# Altium footprint library common.PcbLib: 552 footprints (part 21 of 35)
Each footprint in its own frame and in the unit in brackets; x right, y up, seen from the top. Pads: shape width x height; smd on the part's side, far side on the other; paste and mask are expansions set on the pad; w line width, h text height; cw(c..) or ccw(c..) is an arc to the next point about the centre after c.
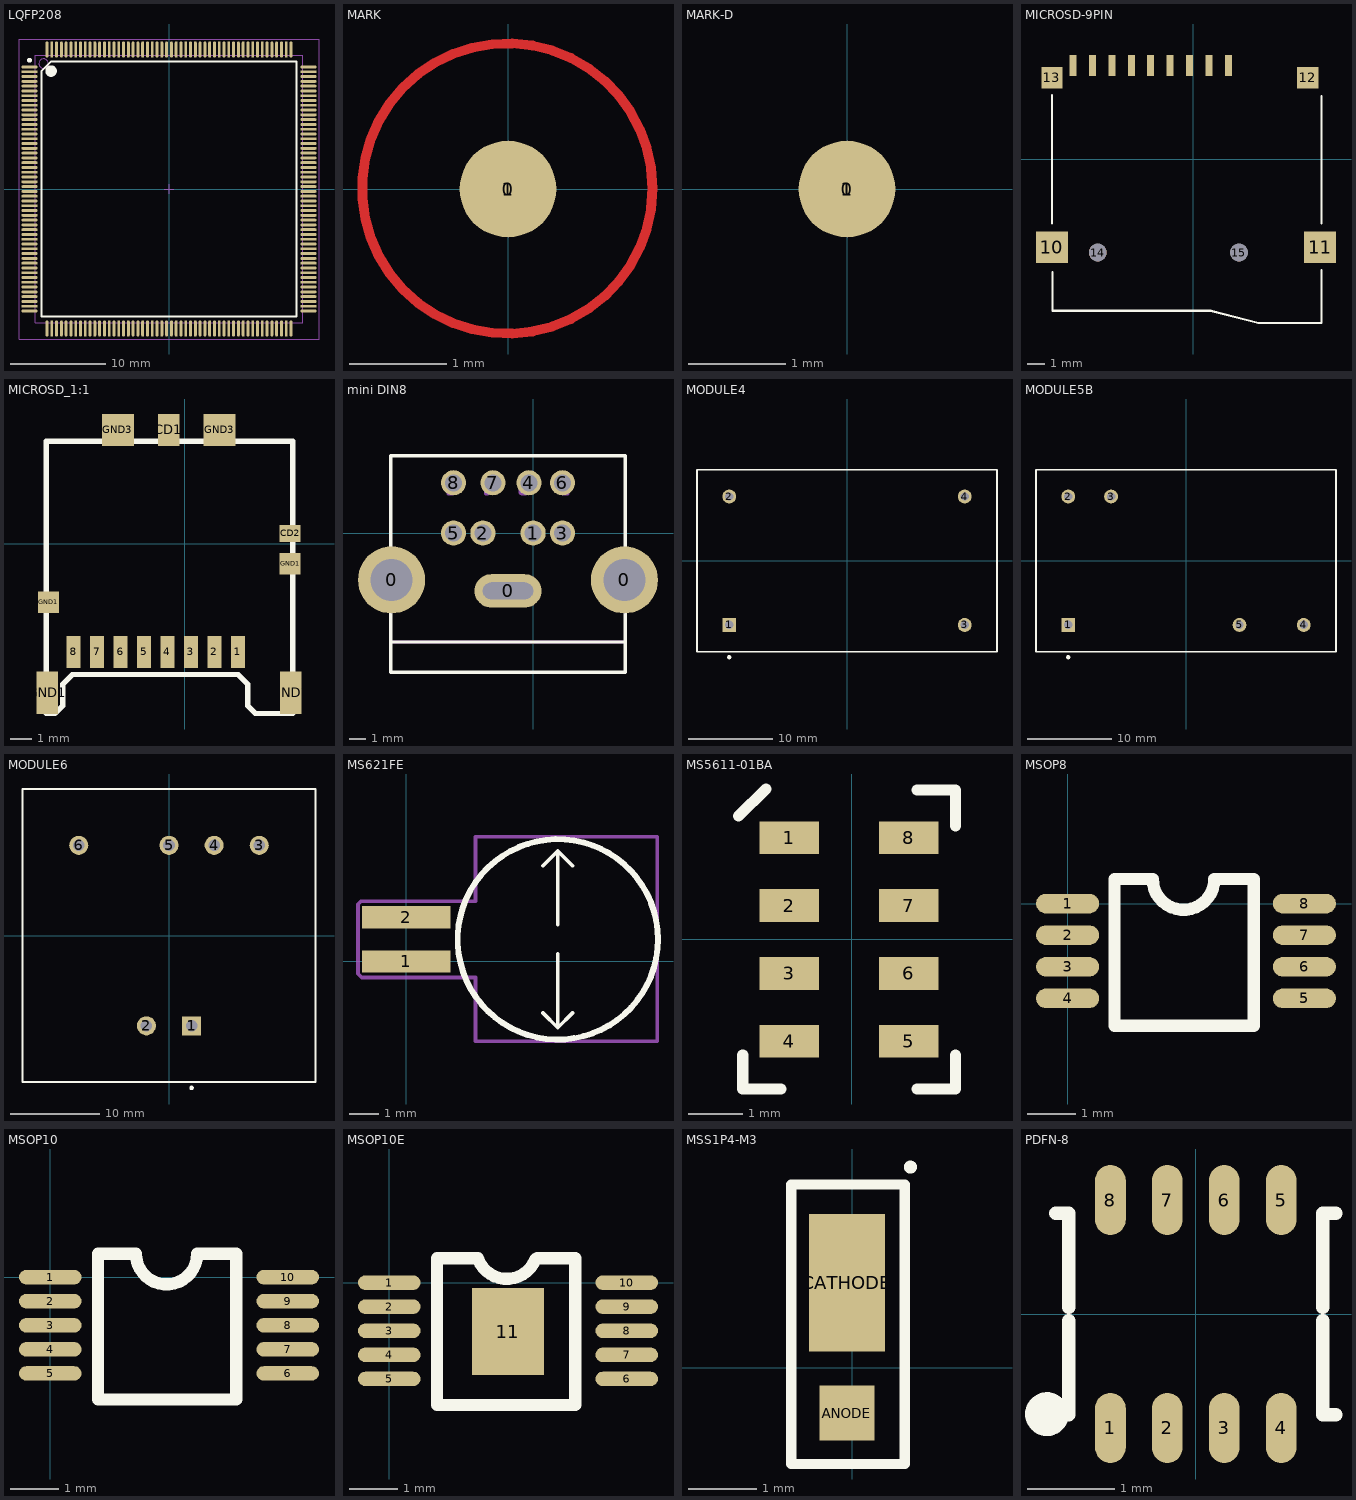
[diagram p20: the footprints below, top view; thin cyan lines are the x and y axes]

## LQFP208 [mm] "TSQFP, 208-Leads, Body 28.00x28.00mm, Pitch 0.50mm, IPC Medium Density"
height 1.6
pads (208):
  oval 1.7x0.3 smd: 1(-14.575,12.75) 2(-14.575,12.25) 3(-14.575,11.75) 4(-14.575,11.25) 5(-14.575,10.75) 6(-14.575,10.25) 7(-14.575,9.75) 8(-14.575,9.25) 9(-14.575,8.75) 10(-14.575,8.25) 11(-14.575,7.75) 12(-14.575,7.25) 13(-14.575,6.75) 14(-14.575,6.25) 15(-14.575,5.75) 16(-14.575,5.25) 17(-14.575,4.75) 18(-14.575,4.25) 19(-14.575,3.75) 20(-14.575,3.25) 21(-14.575,2.75) 22(-14.575,2.25) 23(-14.575,1.75) 24(-14.575,1.25) 25(-14.575,0.75) 26(-14.575,0.25) 27(-14.575,-0.25) 28(-14.575,-0.75) 29(-14.575,-1.25) 30(-14.575,-1.75) 31(-14.575,-2.25) 32(-14.575,-2.75) 33(-14.575,-3.25) 34(-14.575,-3.75) 35(-14.575,-4.25) 36(-14.575,-4.75) 37(-14.575,-5.25) 38(-14.575,-5.75) 39(-14.575,-6.25) 40(-14.575,-6.75) 41(-14.575,-7.25) 42(-14.575,-7.75) 43(-14.575,-8.25) 44(-14.575,-8.75) 45(-14.575,-9.25) 46(-14.575,-9.75) 47(-14.575,-10.25) 48(-14.575,-10.75) 49(-14.575,-11.25) 50(-14.575,-11.75) 51(-14.575,-12.25) 52(-14.575,-12.75) 105(14.575,-12.75) 106(14.575,-12.25) 107(14.575,-11.75) 108(14.575,-11.25) 109(14.575,-10.75) 110(14.575,-10.25) 111(14.575,-9.75) 112(14.575,-9.25) 113(14.575,-8.75) 114(14.575,-8.25) 115(14.575,-7.75) 116(14.575,-7.25) 117(14.575,-6.75) 118(14.575,-6.25) 119(14.575,-5.75) 120(14.575,-5.25) 121(14.575,-4.75) 122(14.575,-4.25) 123(14.575,-3.75) 124(14.575,-3.25) 125(14.575,-2.75) 126(14.575,-2.25) 127(14.575,-1.75) 128(14.575,-1.25) 129(14.575,-0.75) 130(14.575,-0.25) 131(14.575,0.25) 132(14.575,0.75) 133(14.575,1.25) 134(14.575,1.75) 135(14.575,2.25) 136(14.575,2.75) 137(14.575,3.25) 138(14.575,3.75) 139(14.575,4.25) 140(14.575,4.75) 141(14.575,5.25) 142(14.575,5.75) 143(14.575,6.25) 144(14.575,6.75) 145(14.575,7.25) 146(14.575,7.75) 147(14.575,8.25) 148(14.575,8.75) 149(14.575,9.25) 150(14.575,9.75) 151(14.575,10.25) 152(14.575,10.75) 153(14.575,11.25) 154(14.575,11.75) 155(14.575,12.25) 156(14.575,12.75)
  oval 0.3x1.7 smd: 53(-12.75,-14.575) 54(-12.25,-14.575) 55(-11.75,-14.575) 56(-11.25,-14.575) 57(-10.75,-14.575) 58(-10.25,-14.575) 59(-9.75,-14.575) 60(-9.25,-14.575) 61(-8.75,-14.575) 62(-8.25,-14.575) 63(-7.75,-14.575) 64(-7.25,-14.575) 65(-6.75,-14.575) 66(-6.25,-14.575) 67(-5.75,-14.575) 68(-5.25,-14.575) 69(-4.75,-14.575) 70(-4.25,-14.575) 71(-3.75,-14.575) 72(-3.25,-14.575) 73(-2.75,-14.575) 74(-2.25,-14.575) 75(-1.75,-14.575) 76(-1.25,-14.575) 77(-0.75,-14.575) 78(-0.25,-14.575) 79(0.25,-14.575) 80(0.75,-14.575) 81(1.25,-14.575) 82(1.75,-14.575) 83(2.25,-14.575) 84(2.75,-14.575) 85(3.25,-14.575) 86(3.75,-14.575) 87(4.25,-14.575) 88(4.75,-14.575) 89(5.25,-14.575) 90(5.75,-14.575) 91(6.25,-14.575) 92(6.75,-14.575) 93(7.25,-14.575) 94(7.75,-14.575) 95(8.25,-14.575) 96(8.75,-14.575) 97(9.25,-14.575) 98(9.75,-14.575) 99(10.25,-14.575) 100(10.75,-14.575) 101(11.25,-14.575) 102(11.75,-14.575) 103(12.25,-14.575) 104(12.75,-14.575) 157(12.75,14.575) 158(12.25,14.575) 159(11.75,14.575) 160(11.25,14.575) 161(10.75,14.575) 162(10.25,14.575) 163(9.75,14.575) 164(9.25,14.575) 165(8.75,14.575) 166(8.25,14.575) 167(7.75,14.575) 168(7.25,14.575) 169(6.75,14.575) 170(6.25,14.575) 171(5.75,14.575) 172(5.25,14.575) 173(4.75,14.575) 174(4.25,14.575) 175(3.75,14.575) 176(3.25,14.575) 177(2.75,14.575) 178(2.25,14.575) 179(1.75,14.575) 180(1.25,14.575) 181(0.75,14.575) 182(0.25,14.575) 183(-0.25,14.575) 184(-0.75,14.575) 185(-1.25,14.575) 186(-1.75,14.575) 187(-2.25,14.575) 188(-2.75,14.575) 189(-3.25,14.575) 190(-3.75,14.575) 191(-4.25,14.575) 192(-4.75,14.575) 193(-5.25,14.575) 194(-5.75,14.575) 195(-6.25,14.575) 196(-6.75,14.575) 197(-7.25,14.575) 198(-7.75,14.575) 199(-8.25,14.575) 200(-8.75,14.575) 201(-9.25,14.575) 202(-9.75,14.575) 203(-10.25,14.575) 204(-10.75,14.575) 205(-11.25,14.575) 206(-11.75,14.575) 207(-12.25,14.575) 208(-12.75,14.575)
Top Overlay:
  circle w0.6: c-12.325,12.325 r0.3
  circle w0.25: c-14.575,13.45 r0.125
  lines w0.2: -13.325,-13.325 -13.325,12.329 -12.329,13.325 13.325,13.325 13.325,-13.325 -13.325,-13.325
Mechanical 13:
  circle w0.1: c-13.1,13.1 r0.5
  lines w0.1: -14,-14 14,-14 14,14 -14,14 -14,-14
Mechanical 15:
  lines w0.05: -15.675,-15.675 15.675,-15.675 15.675,15.675 -15.675,15.675 -15.675,-15.675
  lines w0.1: -0.5,0 0.5,0 ; 0,-0.5 0,0.5
3D body: height 4.15, standoff -0.08, extent -15.309,-15.249 15.291,15.351

## MARK [mm]
pads (2):
  round 3.1 on Top Solder: 0(0,0)
  round 1 smd: 1(0,0)
Top Layer:
  circle w0.1: c-0.007,0.005 r1.5

## MARK-D [mm]
pads (3):
  round 3.1 on Top Solder: 0(0,0)
  round 3.1 on Bottom Solder: 1(0,0)
  round 1 all layers, no hole: 1(0,0)
Multi-Layer:
  circle w0.1: c-0.007,0.005 r1.5

## MICROSD-9PIN [mm] "9 PIN MICRO SD HEADER"
pads (15):
  rect 0.4x1.2 smd: 1(2,5.3) 2(0.9,5.3) 3(-0.2,5.3) 4(-1.3,5.3) 5(-2.4,5.3) 6(-3.5,5.3) 7(-4.6,5.3) 8(-5.7,5.3) 9(-6.8,5.3)
  rect 1.8x1.8 smd: 10(-8,-5)
  rect 1.8x1.8 smd mask+0.102: 11(7.2,-5)
  rect 1.2x1.2 smd mask+0.102: 12(6.5,4.6) 13(-8,4.6)
  round 1 hole 1: 14(-5.4,-5.3) 15(2.6,-5.3)
Top Overlay:
  lines w0.128: -8,-3.66 -8,3.62 ; -7.96,-6.41 -7.96,-8.6 -3.06,-8.6 1,-8.6 3.7,-9.3 7.28,-9.3 7.28,-6.31 ; 7.28,-3.66 7.28,3.57
3D body: height 2.07, standoff -0.4, extent -8.453,-9.27 7.853,5.94

## MICROSD_1:1 [mm]
height 1.2
pads (16):
  rect 0.65x1.5 smd: 1(2.48,-5.067) 2(1.38,-5.067) 3(0.28,-5.067) 4(-0.82,-5.067) 5(-1.92,-5.067) 6(-3.02,-5.067) 7(-4.12,-5.067) 8(-5.22,-5.067)
  rect 1x1.5 smd: CD1(-0.762,5.334)
  rect 1x0.8 smd: CD2(4.928,0.483)
  rect 1x2 smd: GND1(-6.452,-6.985) GND1(4.953,-6.985)
  rect 1x1 smd: GND1(-6.401,-2.743) GND1(4.928,-0.94)
  rect 1.5x1.5 smd: GND3(-3.15,5.334) GND3(1.626,5.334)
Top Overlay:
  lines w0.254: -6.502,-7.963 -6.096,-7.963 -5.74,-7.607 -5.74,-6.591 -5.283,-6.134 2.489,-6.134 2.946,-6.591 2.946,-7.607 3.302,-7.963 5.055,-7.963 5.055,4.813 -6.502,4.813 -6.502,-7.963
3D body: height 1.41, standoff 0.13, extent -6.427,-7.963 4.953,5.537

## mini DIN8 [mm] "PS2"
pads (11):
  round 4 hole 2.5: 0(-8.45,-2.8) 0(5.45,-2.8)
  oval 4x2 hole 1 slot 3 at 0 deg: 0(-1.5,-3.45)
  round 1.5 hole 1.016: 1(0,0) 2(-3,0) 3(1.75,0) 4(-0.25,3) 5(-4.75,0) 6(1.75,3) 7(-2.4,3) 8(-4.75,3)
Top Overlay:
  lines w0.2: -8.152,-3.568 -8.186,-3.561 -8.219,-3.553 -8.251,-3.544 -8.282,-3.534 -8.311,-3.524 -8.339,-3.513 -8.365,-3.501 -8.389,-3.489 -8.411,-3.476 -8.431,-3.463 -8.448,-3.45 -8.464,-3.436 -8.476,-3.422 -8.487,-3.408 -8.495,-3.394 -8.5,-3.379 -8.504,-3.365 -8.505,-3.351 ; -8.152,-2.024 -8.186,-2.032 -8.219,-2.04 -8.251,-2.049 -8.282,-2.058 -8.311,-2.069 -8.339,-2.08 -8.365,-2.091 -8.389,-2.104 -8.411,-2.116 -8.431,-2.129 -8.448,-2.143 -8.464,-2.157 -8.476,-2.171 -8.487,-2.185 -8.495,-2.199 -8.5,-2.213 -8.504,-2.227 -8.505,-2.241 ; 5.209,-3.553 5.241,-3.544 5.272,-3.534 5.301,-3.524 5.329,-3.513 5.355,-3.501 5.379,-3.489 5.401,-3.476 5.421,-3.463 5.439,-3.45 5.454,-3.436 5.467,-3.422 5.477,-3.408 5.485,-3.394 5.491,-3.379 5.494,-3.365 5.495,-3.351 ; 5.209,-2.04 5.241,-2.049 5.272,-2.058 5.301,-2.069 5.329,-2.08 5.355,-2.091 5.379,-2.104 5.401,-2.116 5.421,-2.129 5.439,-2.143 5.454,-2.157 5.467,-2.171 5.477,-2.185 5.485,-2.199 5.491,-2.213 5.494,-2.227 5.495,-2.241 ; -8.505,-6.496 -8.505,-3.796 -8.505,-3.351 ; -8.505,-6.496 -8.505,-8.296 5.495,-8.296 5.495,-6.496 ; -8.505,-6.496 5.495,-6.496 ; -8.505,-3.351 -8.505,-3.267 -8.505,-2.326 -8.505,-2.241 ; -8.505,-2.241 -8.505,-1.796 -8.505,4.604 5.495,4.604 5.495,-1.796 5.495,-2.241 ; 5.495,-6.496 5.495,-3.796 5.495,-3.351 ; 5.495,-3.351 5.495,-3.267 5.495,-2.326 5.495,-2.241
Mechanical 2:
  drawing of 301 lines, arcs and shapes, not listed
Mechanical 3:
  lines w0.2: -8.505,-6.496 5.495,-6.496 ; -8.118,-3.575 -8.118,-2.018 ; -7.946,-3.796 -7.946,-1.796 ; -7.818,-3.629 -7.818,-1.964 ; -7.661,-3.685 -7.661,-1.908 ; -7.624,-3.74 -7.624,-1.852 ; -7.147,-3.796 -7.147,-1.796 ; 4.137,-3.796 4.137,-1.796 ; 4.615,-3.74 4.615,-1.852 ; 4.652,-3.685 4.652,-1.908 ; 4.808,-3.629 4.808,-1.964 ; 4.936,-3.796 4.936,-1.796 ; 5.108,-3.575 5.108,-2.018
3D body: height 13.3, standoff -3, extent -8.393,-8.396 5.607,4.504

## MODULE4 [mm] "DIP; 4 Round Pins; Row Space 27.94 mm; Pitch 15.24 mm"
height 14
pads (4):
  rect 1.65x1.65 hole 1: 1(-13.97,-7.62)
  round 1.65 hole 1: 2(-13.97,7.62) 3(13.97,-7.62) 4(13.97,7.62)
Top Overlay:
  circle w0.25: c-13.97,-11.45 r0.125
  lines w0.2: -17.8,-10.8 17.8,-10.8 17.8,10.8 -17.8,10.8 -17.8,-10.8
3D body: height 10, standoff 0, extent -17.474,-10.424 17.526,10.576

## MODULE5B [mm] "DIP; 5 Round Pins; Row Space 15.24 mm; Pitch 2.54 mm"
height 14
pads (5):
  rect 1.65x1.65 hole 1: 1(-13.97,-7.62)
  round 1.65 hole 1: 2(-13.97,7.62) 3(-8.89,7.62) 4(13.97,-7.62) 5(6.35,-7.62)
Top Overlay:
  circle w0.25: c-13.97,-11.45 r0.125
  lines w0.2: -17.8,-10.8 17.8,-10.8 17.8,10.8 -17.8,10.8 -17.8,-10.8
3D body: height 10, standoff 0, extent -17.55,-10.525 17.45,10.475

## MODULE6 [mm] "DIP; 6 Round Pins; Row Space 20.32 mm; Pitch 2.54 mm"
height 16.5
pads (6):
  rect 2.15x2.15 hole 1.3: 1(2.54,-10.16)
  round 2.15 hole 1.3: 2(-2.54,-10.16) 3(10.16,10.16) 4(5.08,10.16) 5(0,10.16) 6(-10.16,10.16)
Top Overlay:
  circle w0.25: c2.54,-17.15 r0.125
  lines w0.2: -16.5,-16.5 16.5,-16.5 16.5,16.5 -16.5,16.5 -16.5,-16.5
3D body: height 10, standoff 0, extent -16.602,-16.363 16.398,16.637

## MS621FE [mm]
pads (2):
  rect 3x0.75 smd: 1(0,0) 2(0,1.5)
Top Overlay:
  circle w0.203: c5.15,0.75 r3.4
  lines w0.127: 4.65,-1.75 5.15,-2.25 ; 4.65,3.25 5.15,3.75 ; 5.15,0.25 5.15,-2.25 ; 5.15,1.25 5.15,3.75 ; 5.65,-1.75 5.15,-2.25 ; 5.65,3.25 5.15,3.75
Mechanical 2:
  lines w0.127: -1.632,-0.419 -1.505,-0.546 -0.171,-0.546 2.356,-0.546 2.356,-2.705 8.528,-2.705 8.528,4.23 2.356,4.23 2.356,2.045 -1.53,2.045 -1.632,1.944 -1.632,-0.419
  text ".Comment" at 8.198,1.639 h0.76
  text ".Designator" at 8.198,0.496 h0.76
3D body: height 2.75, standoff 0.05, extent -0.85,-2.65 8.45,4.15

## MS5611-01BA [mm] "BAROMETER"
pads (8):
  rect 1.1x0.6 smd: 1(-1.153,1.867) 2(-1.153,0.617) 3(-1.153,-0.633) 4(-1.153,-1.883) 5(1.047,-1.883) 6(1.047,-0.633) 7(1.047,0.617) 8(1.047,1.867)
Top Overlay:
  lines w0.203: -2.083,2.261 -1.583,2.761 ; -2.007,-2.134 -2.007,-2.758 -1.303,-2.758 ; 1.197,-2.758 1.905,-2.758 1.905,-2.134 ; 1.197,2.742 1.905,2.742 1.905,2.083
3D body: height 1, standoff -0.05, extent -1.55,-2.54 1.45,2.46

## MSOP8 [mm] "VSOP8"
pads (8):
  oval 1.3x0.4 smd: 1(0,0) 2(0,-0.65) 3(0,-1.3) 4(0,-1.95) 5(4.877,-1.95) 6(4.877,-1.3) 7(4.877,-0.65) 8(4.877,0)
Top Overlay:
  lines w0.254: 0.965,-2.515 0.965,0.508 1.753,0.508 ccw(c2.388,0.508) 3.023,0.508 3.835,0.508 3.835,-2.515 0.965,-2.515
3D body: height 1.05, standoff -0.05, extent -0.03,-2.54 4.907,0.56

## MSOP10 [mm] "VSOP8"
height 5
pads (10):
  oval 1.3x0.3 smd: 1(0,0) 2(0,-0.5) 3(0,-1) 4(0,-1.5) 5(0,-2) 6(4.928,-2) 7(4.928,-1.5) 8(4.928,-1) 9(4.928,-0.5) 10(4.928,0)
Top Overlay:
  lines w0.254: 0.991,-2.54 0.991,0.483 1.778,0.483 ccw(c2.413,0.483) 3.048,0.483 3.861,0.483 3.861,-2.54 0.991,-2.54
3D body: height 1.09, standoff 0, extent -0.111,-2.616 5.039,0.584

## MSOP10E [mm] "VSOP8"
height 5
pads (11):
  oval 1.3x0.3 smd: 1(0,0) 2(0,-0.5) 3(0,-1) 4(0,-1.5) 5(0,-2) 6(4.928,-2) 7(4.928,-1.5) 8(4.928,-1) 9(4.928,-0.5) 10(4.928,0)
  rect 1.5x1.8 smd: 11(2.463,-1.016)
Top Overlay:
  lines w0.254: 3.033,0.488 cw(c2.438,0.711) 1.838,0.503 0.991,0.503 0.991,-2.54 3.861,-2.54 3.861,0.503 3.069,0.503 3.048,0.483
3D body: height 1.09, standoff 0, extent -0.111,-2.616 5.039,0.584

## MSS1P4-M3 [mm] "DIODE-SCHOTTKY_MSMP"
pads (2):
  rect 0.8x0.8 smd: ANODE(-0.078,-0.658)
  rect 1.1x2 smd: CATHODE(-0.078,1.242)
Top Overlay:
  circle w0.1: c0.844,2.921 r0.045
  lines w0.15: -0.889,-1.397 -0.889,2.667 0.762,2.667 0.762,-1.397 -0.889,-1.397
3D body: height 0.73, standoff 0, extent -0.76,-0.79 0.64,1.91

## PDFN-8 [mm]
height 0.9
pads (8):
  oval 0.35x0.8 smd: 1(-0.975,-1.3) 2(-0.325,-1.3) 3(0.325,-1.3) 4(0.975,-1.3) 5(0.975,1.3) 6(0.325,1.3) 7(-0.325,1.3) 8(-0.975,1.3)
Top Overlay:
  circle w0.25: c-1.7,-1.143 r0.125
  lines w0.152: -1.6,1.15 -1.45,1.15 -1.45,0.075 ; -1.45,-1.15 -1.45,-0.075 ; 1.45,-0.075 1.45,-1.15 1.6,-1.15 ; 1.45,0.075 1.45,1.15 1.6,1.15
3D body: height 0.9, standoff 0, extent -1.549,-1.4 1.551,1.4